# Altium schematic symbol library TI Amplifiers and Linear Special Function Amplifier.SchLib: 708 symbols (part 3 of 34) (continued)
## LM1877M-9/NOPB
designator U?
Dual Audio Power Amplifier, 0 to 70 degC, 14-pin SOIC (NPA14), Green (RoHS & no Sb/Br); Manufacturer: Texas Instruments; PartNumber: LM1877M-9/NOPB; Analog Supply Max [V]: 24; Analog Supply Min [V]: 6; Input Type: Analog; Max. Number of Speaker Outputs: 2; SubFamily: Mid/High-Power Amplifier; DatasheetVersion: SNAS550B; PackageVersion: Rev. D, 04/2013; PackageReference: NPA14; PackageDescription: 14-Pin Plastic Small Outline, Body 8.992 x 7.493 mm, Pitch 1.27 mm; Supplier 1: Digi-Key; Supplier Part Number 1: LM1877M-9/NOPB-ND; Supplier 2: Farnell; Supplier Part Number 2: 1685321; Supplier 3: Newark; Supplier Part Number 3: 41K3526; Supplier 4: Mouser; Supplier Part Number 4: 926-LM1877M-9/NOPB; Eco-Plan: Green (RoHS & no Sb/Br); Mounting Technology: Surface Mount; ComponentLink1Description: Manufacturer URL; ComponentLink1URL: http://www.ti.com/; ComponentLink2Description: Datasheet; ComponentLink2URL: http://www.ti.com/general/docs/lit/getliterature.tsp?genericPartNumber=LM1877&fileType=pdf; ComponentLink3Description: Package Specification; ComponentLink3URL: http://www.ti.com/lit/ds/symlink/lm1877.pdf
footprint TI-NPA14_N (SOIC, 14-Leads, Body 8.992x7.493mm, Pitch 1.27mm, IPC Medium Density)
footprint TI-NPA14_L (SOIC, 14-Leads, Body 8.992x7.493mm, Pitch 1.27mm, IPC High Density)
footprint TI-NPA14_M (SOIC, 14-Leads, Body 8.992x7.493mm, Pitch 1.27mm, IPC Low Density)
part A pins: 1 BIAS (in), 2 OUT1 (out), 6 IN1 (in), 7 FB1 (in), 8 FB2 (in), 9 IN2 (in), 13 OUT2 (out)
part B pins: 3 GND (power), 4 GND (power), 5 GND (power), 10 GND (power), 11 GND (power), 12 GND (power), 14 V+ (power)

## LM1877MX-9/NOPB
designator U?
Dual Audio Power Amplifier, 0 to 70 degC, 14-pin SOIC (NPA14), Green (RoHS & no Sb/Br); Manufacturer: Texas Instruments; PartNumber: LM1877MX-9/NOPB; Analog Supply Max [V]: 24; Analog Supply Min [V]: 6; Input Type: Analog; Max. Number of Speaker Outputs: 2; SubFamily: Mid/High-Power Amplifier; DatasheetVersion: SNAS550B; PackageVersion: Rev. D, 04/2013; PackageReference: NPA14; PackageDescription: 14-Pin Plastic Small Outline, Body 8.992 x 7.493 mm, Pitch 1.27 mm; Supplier 1: Digi-Key; Supplier Part Number 1: LM1877MX-9/NOPBTR-ND; Supplier 2: Digi-Key; Supplier Part Number 2: LM1877MX-9/NOPBCT-ND; Supplier 3: Digi-Key; Supplier Part Number 3: LM1877MX-9/NOPBDKR-ND; Supplier 4: Newark; Supplier Part Number 4: 41K3527; Supplier 5: Mouser; Supplier Part Number 5: 926-LM1877MX-9/NOPB; Eco-Plan: Green (RoHS & no Sb/Br); Mounting Technology: Surface Mount; ComponentLink1Description: Manufacturer URL; ComponentLink1URL: http://www.ti.com/; ComponentLink2Description: Datasheet; ComponentLink2URL: http://www.ti.com/general/docs/lit/getliterature.tsp?genericPartNumber=LM1877&fileType=pdf; ComponentLink3Description: Package Specification; ComponentLink3URL: http://www.ti.com/lit/ds/symlink/lm1877.pdf
footprint TI-NPA14_N (SOIC, 14-Leads, Body 8.992x7.493mm, Pitch 1.27mm, IPC Medium Density)
footprint TI-NPA14_L (SOIC, 14-Leads, Body 8.992x7.493mm, Pitch 1.27mm, IPC High Density)
footprint TI-NPA14_M (SOIC, 14-Leads, Body 8.992x7.493mm, Pitch 1.27mm, IPC Low Density)
part A pins: 1 BIAS (in), 2 OUT1 (out), 6 IN1 (in), 7 FB1 (in), 8 FB2 (in), 9 IN2 (in), 13 OUT2 (out)
part B pins: 3 GND (power), 4 GND (power), 5 GND (power), 10 GND (power), 11 GND (power), 12 GND (power), 14 V+ (power)

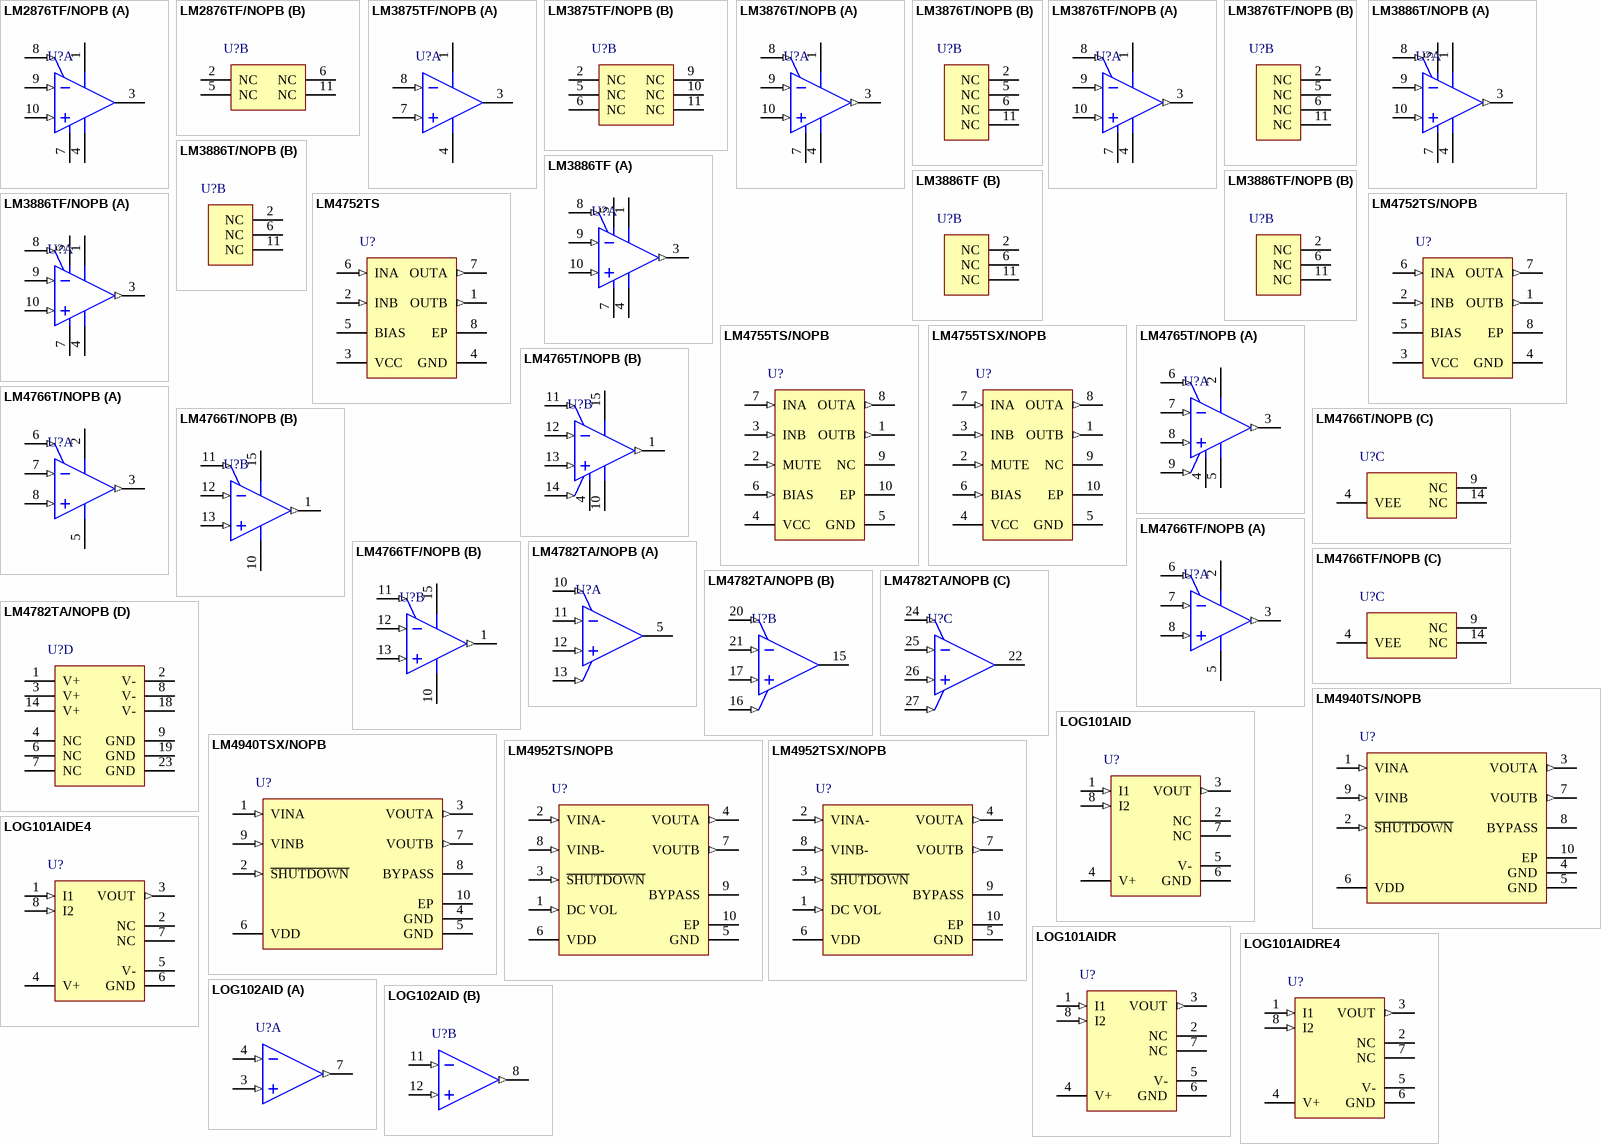
[diagram p3: symbols LM2876TF/NOPB to LOG102AID]

## LM2876TF/NOPB
designator U?
High-Performance 40 Watt Audio Power Amplifier with Mute, -20 to 85 degC, 11-pin FM (NDA11), Pb-Free (RoHS Exempt); Manufacturer: Texas Instruments; PartNumber: LM2876TF/NOPB; Input Type: Analog; Max. Number of Speaker Outputs: 1; SubFamily: Mid/High-Power Amplifier; DatasheetVersion: SNAS088C; PackageVersion: Rev. D, 02/2013; PackageReference: NDA11; PackageDescription: 11-Pin Metal Flange Mount, Body 20.02 x 4.5 mm, Pitch 1.7 mm; Supplier 1: Digi-Key; Supplier Part Number 1: LM2876TF/NOPB-ND; Supplier 2: Farnell; Supplier Part Number 2: 1694009; Supplier 3: Newark; Supplier Part Number 3: 41K4439; Supplier 4: Mouser; Supplier Part Number 4: 926-LM2876TF/NOPB; Eco-Plan: Pb-Free (RoHS Exempt); Mounting Technology: Through Hole; ComponentLink1Description: Manufacturer URL; ComponentLink1URL: http://www.ti.com/; ComponentLink2Description: Datasheet; ComponentLink2URL: http://www.ti.com/general/docs/lit/getliterature.tsp?genericPartNumber=LM2876&fileType=pdf; ComponentLink3Description: Package Specification; ComponentLink3URL: http://www.ti.com/lit/ml/mmsf015/mmsf015.pdf
footprint TI-NDA11 (FM, 11-Leads, Body 20.02x4.5mm, Pitch 1.7mm)
part A pins: 1 V+ (power), 3 OUT (hiz), 4 V- (power), 7 GND (power), 8 MUTE (in), 9 VIN- (in), 10 VIN+ (in)
part B pins: 2 NC, 5 NC, 6 NC, 11 NC

## LM3875TF/NOPB
designator U?
High-Performance 56 W Audio Power Amplifier, -20 to 85 degC, 11-pin FM (NDA11), Pb-Free (RoHS Exempt); Manufacturer: Texas Instruments; PartNumber: LM3875TF/NOPB; Analog Supply Max [V]: 20; Analog Supply Min [V]: 84; Input Type: Analog; SubFamily: Mid/High-Power Amplifier; DatasheetVersion: SNAS083D; PackageVersion: Rev. D, 02/2013; PackageReference: NDA11; PackageDescription: 11-Pin Metal Flange Mount, Body 20.02 x 4.5 mm, Pitch 1.7 mm; Supplier 1: Digi-Key; Supplier Part Number 1: LM3875TF/NOPB-ND; Supplier 2: Farnell; Supplier Part Number 2: 1468867; Supplier 3: Newark; Supplier Part Number 3: 41K5106; Supplier 4: Mouser; Supplier Part Number 4: 926-LM3875TF/NOPB; Eco-Plan: Pb-Free (RoHS Exempt); Mounting Technology: Through Hole; ComponentLink1Description: Manufacturer URL; ComponentLink1URL: http://www.ti.com/; ComponentLink2Description: Datasheet; ComponentLink2URL: http://www.ti.com/general/docs/lit/getliterature.tsp?genericPartNumber=LM3875&fileType=pdf; ComponentLink3Description: Package Specification; ComponentLink3URL: http://www.ti.com/lit/ml/mmsf015/mmsf015.pdf
footprint TI-NDA11 (FM, 11-Leads, Body 20.02x4.5mm, Pitch 1.7mm)
part A pins: 1 V+ (power), 3 OUT (hiz), 4 V- (power), 7 VIN+ (in), 8 VIN- (in)
part B pins: 2 NC, 5 NC, 6 NC, 9 NC, 10 NC, 11 NC

## LM3876T/NOPB
designator U?
High-Performance 56 W Audio Power Amplifier with Mute, -20 to 85 degC, 11-pin FM (NDJ11), Green (RoHS & no Sb/Br); Manufacturer: Texas Instruments; PartNumber: LM3876T/NOPB; Analog Supply Max [V]: 24; Analog Supply Min [V]: 84; Input Type: Analog; SubFamily: Mid/High-Power Amplifier; DatasheetVersion: SNAS090D; PackageVersion: Rev. B, 05/2013; PackageReference: NDJ11; PackageDescription: 11-Pin Metal Flange Mount, Body 20.02 x 4.5, Pitch 1.7 mm; Supplier 1: Digi-Key; Supplier Part Number 1: LM3876T/NOPB-ND; Supplier 2: Farnell; Supplier Part Number 2: 1184989; Supplier 3: Newark; Supplier Part Number 3: 41K5107; Supplier 4: Mouser; Supplier Part Number 4: 926-LM3876T/NOPB; Eco-Plan: Green (RoHS & no Sb/Br); Mounting Technology: Through Hole; ComponentLink1Description: Manufacturer URL; ComponentLink1URL: http://www.ti.com/; ComponentLink2Description: Datasheet; ComponentLink2URL: http://www.ti.com/general/docs/lit/getliterature.tsp?genericPartNumber=LM3876&fileType=pdf; ComponentLink3Description: Package Specification; ComponentLink3URL: http://www.ti.com/lit/ds/symlink/lm3886.pdf
footprint TI-NDJ11 (FM, 11-Leads, Body 20.02x4.5mm, Pitch 1.7mm)
part A pins: 1 V+ (power), 3 OUTPUT (out), 4 V- (power), 7 GND (power), 8 MUTE (in), 9 VIN- (in), 10 VIN+ (in)
part B pins: 2 NC, 5 NC, 6 NC, 11 NC

## LM3876TF/NOPB
designator U?
High-Performance 56 W Audio Power Amplifier with Mute, -20 to 85 degC, 11-pin FM (NDA11), Pb-Free (RoHS Exempt); Manufacturer: Texas Instruments; PartNumber: LM3876TF/NOPB; Analog Supply Max [V]: 24; Analog Supply Min [V]: 84; Input Type: Analog; SubFamily: Mid/High-Power Amplifier; DatasheetVersion: SNAS090D; PackageVersion: Rev. D, 02/2013; PackageReference: NDA11; PackageDescription: 11-Pin Metal Flange Mount, Body 20.02 x 4.5 mm, Pitch 1.7 mm; Supplier 1: Digi-Key; Supplier Part Number 1: LM3876TF/NOPB-ND; Supplier 2: Newark; Supplier Part Number 2: 41K5108; Supplier 3: Mouser; Supplier Part Number 3: 926-LM3876TF/NOPB; Eco-Plan: Pb-Free (RoHS Exempt); Mounting Technology: Through Hole; ComponentLink1Description: Manufacturer URL; ComponentLink1URL: http://www.ti.com/; ComponentLink2Description: Datasheet; ComponentLink2URL: http://www.ti.com/general/docs/lit/getliterature.tsp?genericPartNumber=LM3876&fileType=pdf; ComponentLink3Description: Package Specification; ComponentLink3URL: http://www.ti.com/lit/ml/mmsf015/mmsf015.pdf
footprint TI-NDA11 (FM, 11-Leads, Body 20.02x4.5mm, Pitch 1.7mm)
part A pins: 1 V+ (power), 3 OUTPUT (out), 4 V- (power), 7 GND (power), 8 MUTE (in), 9 VIN- (in), 10 VIN+ (in)
part B pins: 2 NC, 5 NC, 6 NC, 11 NC

## LM3886T/NOPB
designator U?
High-Performance 68 W Audio Power Amplifier with Mute, 0 to 70 degC, 11-pin FM (NDJ11), Green (RoHS & no Sb/Br); Manufacturer: Texas Instruments; PartNumber: LM3886T/NOPB; Input Type: Analog; SubFamily: Mid/High-Power Amplifier; DatasheetVersion: SNAS091C; PackageVersion: Rev. B, 05/2013; PackageReference: NDJ11; PackageDescription: 11-Pin Metal Flange Mount, Body 20.02 x 4.5, Pitch 1.7 mm; Supplier 1: Digi-Key; Supplier Part Number 1: LM3886T/NOPB-ND; Supplier 2: Farnell; Supplier Part Number 2: 1468869; Supplier 3: Newark; Supplier Part Number 3: 41K5109; Supplier 4: Mouser; Supplier Part Number 4: 926-LM3886T/NOPB; Eco-Plan: Green (RoHS & no Sb/Br); Mounting Technology: Through Hole; ComponentLink1Description: Manufacturer URL; ComponentLink1URL: http://www.ti.com/; ComponentLink2Description: Datasheet; ComponentLink2URL: http://www.ti.com/general/docs/lit/getliterature.tsp?genericPartNumber=LM3886&fileType=pdf; ComponentLink3Description: Package Specification; ComponentLink3URL: http://www.ti.com/lit/ds/symlink/lm3886.pdf
footprint TI-NDJ11 (FM, 11-Leads, Body 20.02x4.5mm, Pitch 1.7mm)
part A pins: 1 V+ (power), 3 OUTPUT (out), 4 V- (power), 5 V+ (power), 7 GND (power), 8 MUTE (in), 9 VIN- (in), 10 VIN+ (in)
part B pins: 2 NC, 6 NC, 11 NC

## LM3886TF
designator U?
High-Performance 68 W Audio Power Amplifier with Mute, 0 to 70 degC, 11-pin FM (NDA11); Manufacturer: Texas Instruments; PartNumber: LM3886TF; Input Type: Analog; SubFamily: Mid/High-Power Amplifier; DatasheetVersion: SNAS091C; PackageVersion: Rev. D, 02/2013; PackageReference: NDA11; PackageDescription: 11-Pin Metal Flange Mount, Body 20.02 x 4.5 mm, Pitch 1.7 mm; Supplier 1: Digi-Key; Supplier Part Number 1: LM3886TF-ND; Supplier 2: Farnell; Supplier Part Number 2: 9489681; Supplier 3: Farnell; Supplier Part Number 3: 1523846; Supplier 4: Newark; Supplier Part Number 4: 92F299; Supplier 5: Mouser; Supplier Part Number 5: 926-LM3886TF; Mounting Technology: Through Hole; ComponentLink1Description: Manufacturer URL; ComponentLink1URL: http://www.ti.com/; ComponentLink2Description: Datasheet; ComponentLink2URL: http://www.ti.com/general/docs/lit/getliterature.tsp?genericPartNumber=LM3886&fileType=pdf; ComponentLink3Description: Package Specification; ComponentLink3URL: http://www.ti.com/lit/ml/mmsf015/mmsf015.pdf
footprint TI-NDA11 (FM, 11-Leads, Body 20.02x4.5mm, Pitch 1.7mm)
part A pins: 1 V+ (power), 3 OUTPUT (out), 4 V- (power), 5 V+ (power), 7 GND (power), 8 MUTE (in), 9 VIN- (in), 10 VIN+ (in)
part B pins: 2 NC, 6 NC, 11 NC

## LM3886TF/NOPB
designator U?
High-Performance 68 W Audio Power Amplifier with Mute, 0 to 70 degC, 11-pin FM (NDA11), Pb-Free (RoHS Exempt); Manufacturer: Texas Instruments; PartNumber: LM3886TF/NOPB; Input Type: Analog; SubFamily: Mid/High-Power Amplifier; DatasheetVersion: SNAS091C; PackageVersion: Rev. D, 02/2013; PackageReference: NDA11; PackageDescription: 11-Pin Metal Flange Mount, Body 20.02 x 4.5 mm, Pitch 1.7 mm; Supplier 1: Digi-Key; Supplier Part Number 1: LM3886TF/NOPB-ND; Supplier 2: Farnell; Supplier Part Number 2: 1179742; Supplier 3: Newark; Supplier Part Number 3: 41K5110; Supplier 4: Mouser; Supplier Part Number 4: 926-LM3886TF/NOPB; Eco-Plan: Pb-Free (RoHS Exempt); Mounting Technology: Through Hole; ComponentLink1Description: Manufacturer URL; ComponentLink1URL: http://www.ti.com/; ComponentLink2Description: Datasheet; ComponentLink2URL: http://www.ti.com/general/docs/lit/getliterature.tsp?genericPartNumber=LM3886&fileType=pdf; ComponentLink3Description: Package Specification; ComponentLink3URL: http://www.ti.com/lit/ml/mmsf015/mmsf015.pdf
footprint TI-NDA11 (FM, 11-Leads, Body 20.02x4.5mm, Pitch 1.7mm)
part A pins: 1 V+ (power), 3 OUTPUT (out), 4 V- (power), 5 V+ (power), 7 GND (power), 8 MUTE (in), 9 VIN- (in), 10 VIN+ (in)
part B pins: 2 NC, 6 NC, 11 NC

## LM4752TS
designator U?
Stereo 11 W Audio Power Amplifier, 0 to 70 degC, 7-pin DPAK (KTW7); Manufacturer: Texas Instruments; PartNumber: LM4752TS; Input Type: Analog; Max. Number of Speaker Outputs: 2; SubFamily: Mid/High-Power Amplifier; DatasheetVersion: SNAS006E; PackageVersion: 4201284/A, 08/2001; PackageReference: KTW7; PackageDescription: 7-Pin Plastic Flange Mount, Body 8.89 x 10.1 mm, Pitch 1.27 mm; Supplier 1: Digi-Key; Supplier Part Number 1: LM4752TS-ND; Supplier 2: Farnell; Supplier Part Number 2: 1798325; Supplier 3: Newark; Supplier Part Number 3: 73R9744; Supplier 4: Newark; Supplier Part Number 4: 48F7272; Supplier 5: Mouser; Supplier Part Number 5: 926-LM4752TS; Mounting Technology: Surface Mount; Code_JEDEC: MO-169; ComponentLink1Description: Manufacturer URL; ComponentLink1URL: http://www.ti.com/; ComponentLink2Description: Datasheet; ComponentLink2URL: http://www.ti.com/general/docs/lit/getliterature.tsp?genericPartNumber=LM4752&fileType=pdf; ComponentLink3Description: Package Specification; ComponentLink3URL: http://www.ti.com/litv/pdf/mpsf015
footprint TI-KTW7_N (DPAK, 7-Leads, Body 9.4x10.4mm, Pitch 1.27mm, IPC Medium Density)
footprint TI-KTW7_L (DPAK, 7-Leads, Body 9.4x10.4mm, Pitch 1.27mm, IPC High Density)
footprint TI-KTW7_M (DPAK, 7-Leads, Body 9.4x10.4mm, Pitch 1.27mm, IPC Low Density)
pins: 1 OUTB (out), 2 INB (in), 3 VCC (power), 4 GND (power), 5 BIAS, 6 INA (in), 7 OUTA (out), 8 EP

## LM4752TS/NOPB
designator U?
Stereo 11 W Audio Power Amplifier, 0 to 70 degC, 7-pin DPAK (KTW7), Pb-Free (RoHS Exempt); Manufacturer: Texas Instruments; PartNumber: LM4752TS/NOPB; Input Type: Analog; Max. Number of Speaker Outputs: 2; SubFamily: Mid/High-Power Amplifier; DatasheetVersion: SNAS006E; PackageVersion: 4201284/A, 08/2001; PackageReference: KTW7; PackageDescription: 7-Pin Plastic Flange Mount, Body 8.89 x 10.1 mm, Pitch 1.27 mm; Supplier 1: Digi-Key; Supplier Part Number 1: LM4752TS/NOPB-ND; Supplier 2: Farnell; Supplier Part Number 2: 1853252; Supplier 3: Newark; Supplier Part Number 3: 41K5583; Supplier 4: Mouser; Supplier Part Number 4: 926-LM4752TS/NOPB; Eco-Plan: Pb-Free (RoHS Exempt); Mounting Technology: Surface Mount; Code_JEDEC: MO-169; ComponentLink1Description: Manufacturer URL; ComponentLink1URL: http://www.ti.com/; ComponentLink2Description: Datasheet; ComponentLink2URL: http://www.ti.com/general/docs/lit/getliterature.tsp?genericPartNumber=LM4752&fileType=pdf; ComponentLink3Description: Package Specification; ComponentLink3URL: http://www.ti.com/litv/pdf/mpsf015
footprint TI-KTW7_N (DPAK, 7-Leads, Body 9.4x10.4mm, Pitch 1.27mm, IPC Medium Density)
footprint TI-KTW7_L (DPAK, 7-Leads, Body 9.4x10.4mm, Pitch 1.27mm, IPC High Density)
footprint TI-KTW7_M (DPAK, 7-Leads, Body 9.4x10.4mm, Pitch 1.27mm, IPC Low Density)
pins: 1 OUTB (out), 2 INB (in), 3 VCC (power), 4 GND (power), 5 BIAS, 6 INA (in), 7 OUTA (out), 8 EP

## LM4755TS/NOPB
designator U?
Stereo 11 W Audio Power Amplifier with Mute, -40 to 85 degC, 9-pin DPAK (KTW9), Pb-Free (RoHS Exempt); Manufacturer: Texas Instruments; PartNumber: LM4755TS/NOPB; Input Type: Analog; Max. Number of Speaker Outputs: 2; SubFamily: Mid/High-Power Amplifier; DatasheetVersion: SNAS010E; PackageVersion: Rev. B, 04/2013; PackageReference: TI-KTW9; PackageDescription: 9-Pin Plastic Flange Mount, Bdoy 10.16 x 4.57 mm, Pitch 0.97 mm; Supplier 1: Digi-Key; Supplier Part Number 1: LM4755TS/NOPB-ND; Supplier 2: Farnell; Supplier Part Number 2: 1685378; Supplier 3: Newark; Supplier Part Number 3: 41K5585; Supplier 4: Mouser; Supplier Part Number 4: 926-LM4755TS/NOPB; Eco-Plan: Pb-Free (RoHS Exempt); Mounting Technology: Through Hole; ComponentLink1Description: Manufacturer URL; ComponentLink1URL: http://www.ti.com/; ComponentLink2Description: Datasheet; ComponentLink2URL: http://www.ti.com/general/docs/lit/getliterature.tsp?genericPartNumber=LM4755&fileType=pdf; ComponentLink3Description: Package Specification; ComponentLink3URL: http://www.ti.com/lit/ml/mpsf047/mpsf047.pdf
footprint TI-KTW9_N (DPAK, 9-Leads, Body 10.16x8.69mm, Pitch 0.97mm, IPC Medium Density)
footprint TI-KTW9_L (DPAK, 9-Leads, Body 10.16x8.69mm, Pitch 0.97mm, IPC High Density)
footprint TI-KTW9_M (DPAK, 9-Leads, Body 10.16x8.69mm, Pitch 0.97mm, IPC Low Density)
pins: 1 OUTB (out), 2 MUTE (in), 3 INB (in), 4 VCC (power), 5 GND (power), 6 BIAS (in), 7 INA (in), 8 OUTA (out), 9 NC, 10 EP

## LM4755TSX/NOPB
designator U?
Stereo 11 W Audio Power Amplifier with Mute, -40 to 85 degC, 9-pin DPAK (KTW9), Pb-Free (RoHS Exempt); Manufacturer: Texas Instruments; PartNumber: LM4755TSX/NOPB; Input Type: Analog; Max. Number of Speaker Outputs: 2; SubFamily: Mid/High-Power Amplifier; DatasheetVersion: SNAS010E; PackageVersion: Rev. B, 04/2013; PackageReference: TI-KTW9; PackageDescription: 9-Pin Plastic Flange Mount, Bdoy 10.16 x 4.57 mm, Pitch 0.97 mm; Supplier 1: Digi-Key; Supplier Part Number 1: LM4755TSX/NOPBTR-ND; Supplier 2: Digi-Key; Supplier Part Number 2: LM4755TSX/NOPBCT-ND; Supplier 3: Digi-Key; Supplier Part Number 3: LM4755TSX/NOPBDKR-ND; Supplier 4: Newark; Supplier Part Number 4: 41K5586; Supplier 5: Mouser; Supplier Part Number 5: 926-LM4755TSX/NOPB; Eco-Plan: Pb-Free (RoHS Exempt); Mounting Technology: Through Hole; ComponentLink1Description: Manufacturer URL; ComponentLink1URL: http://www.ti.com/; ComponentLink2Description: Datasheet; ComponentLink2URL: http://www.ti.com/general/docs/lit/getliterature.tsp?genericPartNumber=LM4755&fileType=pdf; ComponentLink3Description: Package Specification; ComponentLink3URL: http://www.ti.com/lit/ml/mpsf047/mpsf047.pdf
footprint TI-KTW9_N (DPAK, 9-Leads, Body 10.16x8.69mm, Pitch 0.97mm, IPC Medium Density)
footprint TI-KTW9_L (DPAK, 9-Leads, Body 10.16x8.69mm, Pitch 0.97mm, IPC High Density)
footprint TI-KTW9_M (DPAK, 9-Leads, Body 10.16x8.69mm, Pitch 0.97mm, IPC Low Density)
pins: 1 OUTB (out), 2 MUTE (in), 3 INB (in), 4 VCC (power), 5 GND (power), 6 BIAS (in), 7 INA (in), 8 OUTA (out), 9 NC, 10 EP

## LM4765T/NOPB
designator U?
Overture Audio Power Amplifier Series Dual 30 Watt Audio Power Amplifier with Mute & Standby Mode, -20 to 85 degC, 15-pin FM (NDL15), Green (RoHS & no Sb/Br); Manufacturer: Texas Instruments; PartNumber: LM4765T/NOPB; Input Type: Analog; Max. Number of Speaker Outputs: 2; SubFamily: Mid/High-Power Amplifier; DatasheetVersion: SNAS030C; PackageVersion: Rev. B, 04/2013; PackageReference: NDL15; PackageDescription: 15-Pin Metal Flange Mount, Body 20.02 x 4.5 mm, Pitch 1.27 mm; Supplier 1: Digi-Key; Supplier Part Number 1: LM4765T/NOPB-ND; Supplier 2: Farnell; Supplier Part Number 2: 1685341; Supplier 3: Newark; Supplier Part Number 3: 41K5588; Supplier 4: Mouser; Supplier Part Number 4: 926-LM4765T/NOPB; Eco-Plan: Green (RoHS & no Sb/Br); Mounting Technology: Through Hole; ComponentLink1Description: Manufacturer URL; ComponentLink1URL: http://www.ti.com/; ComponentLink2Description: Datasheet; ComponentLink2URL: http://www.ti.com/general/docs/lit/getliterature.tsp?genericPartNumber=LM4765&fileType=pdf; ComponentLink3Description: Package Specification; ComponentLink3URL: http://www.ti.com/lit/ds/symlink/lm1876.pdf
footprint TI-NDL15 (FM, 15-Leads, Body 20.02x4.5mm, Pitch 1.27mm)
pins on every part: 4 VEE (power)
part A pins: 2 VCC A (power), 3 OUT A (out), 5 GND A (power), 6 MUTE A (in), 7 IN A- (in), 8 IN A+ (in), 9 STANDBY A (in)
part B pins: 1 OUT B (out), 10 GND B (power), 11 MUTE B (in), 12 IN B- (in), 13 IN B+ (in), 14 STANDBY B (in), 15 VCC B (power)

## LM4766T/NOPB
designator U?
Overture Audio Power Amplifier Series Dual 40 Watt Audio Power Amplifier with Mute, -20 to 85 degC, 15-pin FM (NDL15), Green (RoHS & no Sb/Br); Manufacturer: Texas Instruments; PartNumber: LM4766T/NOPB; Input Type: Analog; Max. Number of Speaker Outputs: 2; SubFamily: Mid/High-Power Amplifier; DatasheetVersion: SNAS031F; PackageVersion: Rev. B, 04/2013; PackageReference: NDL15; PackageDescription: 15-Pin Metal Flange Mount, Body 20.02 x 4.5 mm, Pitch 1.27 mm; Supplier 1: Digi-Key; Supplier Part Number 1: LM4766T/NOPB-ND; Supplier 2: Newark; Supplier Part Number 2: 41K5589; Supplier 3: Mouser; Supplier Part Number 3: 926-LM4766T/NOPB; Eco-Plan: Green (RoHS & no Sb/Br); Mounting Technology: Through Hole; ComponentLink1Description: Manufacturer URL; ComponentLink1URL: http://www.ti.com/; ComponentLink2Description: Datasheet; ComponentLink2URL: http://www.ti.com/general/docs/lit/getliterature.tsp?genericPartNumber=LM4766&fileType=pdf; ComponentLink3Description: Package Specification; ComponentLink3URL: http://www.ti.com/lit/ds/symlink/lm1876.pdf
footprint TI-NDL15 (FM, 15-Leads, Body 20.02x4.5mm, Pitch 1.27mm)
part A pins: 2 VCC A (power), 3 OUT A (out), 5 GND A (power), 6 MUTE A (in), 7 IN A- (in), 8 IN A+ (in)
part B pins: 1 OUT B (out), 10 GND B (power), 11 MUTE B (in), 12 IN B- (in), 13 IN B+ (in), 15 VCC B (power)
part C pins: 4 VEE (power), 9 NC, 14 NC

## LM4766TF/NOPB
designator U?
Overture Audio Power Amplifier Series Dual 40 Watt Audio Power Amplifier with Mute, -20 to 85 degC, 15-pin FM (NDB15), Pb-Free (RoHS Exempt); Manufacturer: Texas Instruments; PartNumber: LM4766TF/NOPB; Input Type: Analog; Max. Number of Speaker Outputs: 2; SubFamily: Mid/High-Power Amplifier; DatasheetVersion: SNAS031F; PackageVersion: Rev. B, 02/2013; PackageReference: NDB15; PackageDescription: 15-Pin Metal Flange Mount, Body 20.02 x 4.5 mm, Pitch 1.27 mm; Supplier 1: Digi-Key; Supplier Part Number 1: LM4766TF/NOPB-ND; Supplier 2: Farnell; Supplier Part Number 2: 1685379; Supplier 3: Newark; Supplier Part Number 3: 41K5590; Supplier 4: Mouser; Supplier Part Number 4: 926-LM4766TF/NOPB; Eco-Plan: Pb-Free (RoHS Exempt); Mounting Technology: Through Hole; ComponentLink1Description: Manufacturer URL; ComponentLink1URL: http://www.ti.com/; ComponentLink2Description: Datasheet; ComponentLink2URL: http://www.ti.com/general/docs/lit/getliterature.tsp?genericPartNumber=LM4766&fileType=pdf; ComponentLink3Description: Package Specification; ComponentLink3URL: http://www.ti.com/lit/ml/mmsf016/mmsf016.pdf
footprint TI-NDB15 (FM, 15-Leads, Body 20.02x4.5mm, Pitch 1.27mm)
part A pins: 2 VCC A (power), 3 OUT A (out), 5 GND A (power), 6 MUTE A (in), 7 IN A- (in), 8 IN A+ (in)
part B pins: 1 OUT B (out), 10 GND B (power), 11 MUTE B (in), 12 IN B- (in), 13 IN B+ (in), 15 VCC B (power)
part C pins: 4 VEE (power), 9 NC, 14 NC

## LM4782TA/NOPB
designator U?
3 Channel 25 W Audio Power Amplifier with Mute and Standby, -20 to 85 degC, 27-pin TO-220 (NDM27), Green (RoHS & no Sb/Br); Manufacturer: Texas Instruments; PartNumber: LM4782TA/NOPB; Input Type: Analog; Max. Number of Speaker Outputs: 3; SubFamily: Mid/High-Power Amplifier; DatasheetVersion: SNAS231B; PackageVersion: Rev. B, 08/2012; PackageReference: NDM27; PackageDescription: 27-Pin Metal Flange Mount, Body 29.21 x 4.496 mm, Pitch 1 mm; Supplier 1: Digi-Key; Supplier Part Number 1: LM4782TA/NOPB-ND; Supplier 2: Mouser; Supplier Part Number 2: 926-LM4782TA/NOPB; Eco-Plan: Green (RoHS & no Sb/Br); Mounting Technology: Through Hole; ComponentLink1Description: Manufacturer URL; ComponentLink1URL: http://www.ti.com/; ComponentLink2Description: Datasheet; ComponentLink2URL: http://www.ti.com/general/docs/lit/getliterature.tsp?genericPartNumber=LM4782&fileType=pdf; ComponentLink3Description: Package Specification; ComponentLink3URL: http://www.ti.com/lit/ml/mmsf018/mmsf018.pdf
footprint TI-NDM27_V (NDM, 27-Leads, Body 29.21x4.496mm, Pitch 1mm)
part A pins: 5 OUT 1 (hiz), 10 MUTE 1 (in), 11 IN 1- (in), 12 IN 1+ (in), 13 STBY 1 (in)
part B pins: 15 OUT 2 (hiz), 16 STBY 2 (in), 17 IN 2+ (in), 20 MUTE 2 (in), 21 IN 2- (in)
part C pins: 22 OUT 3 (hiz), 24 MUTE 3 (in), 25 IN 3- (in), 26 IN 3+ (in), 27 STBY 3 (in)
part D pins: 1 V+ (power), 2 V- (power), 3 V+ (power), 4 NC, 6 NC, 7 NC, 8 V- (power), 9 GND (power), 14 V+ (power), 18 V- (power), 19 GND (power), 23 GND (power)

## LM4940TS/NOPB
designator U?
6 W Stereo Audio Power Amplifier, -40 to 85 degC, 9-pin DPAK (KTW9), Pb-Free (RoHS Exempt); Manufacturer: Texas Instruments; PartNumber: LM4940TS/NOPB; Input Type: Analog; Max. Number of Speaker Outputs: 2; SubFamily: Mid/High-Power Amplifier; DatasheetVersion: SNAS219C; PackageVersion: Rev. B, 04/2013; PackageReference: TI-KTW9; PackageDescription: 9-Pin Plastic Flange Mount, Bdoy 10.16 x 4.57 mm, Pitch 0.97 mm; Supplier 1: Digi-Key; Supplier Part Number 1: LM4940TS/NOPB-ND; Supplier 2: Mouser; Supplier Part Number 2: 926-LM4940TS/NOPB; Eco-Plan: Pb-Free (RoHS Exempt); Mounting Technology: Through Hole; ComponentLink1Description: Manufacturer URL; ComponentLink1URL: http://www.ti.com/; ComponentLink2Description: Datasheet; ComponentLink2URL: http://www.ti.com/general/docs/lit/getliterature.tsp?genericPartNumber=LM4940&fileType=pdf; ComponentLink3Description: Package Specification; ComponentLink3URL: http://www.ti.com/lit/ml/mpsf047/mpsf047.pdf
footprint TI-KTW9_N (DPAK, 9-Leads, Body 10.16x8.69mm, Pitch 0.97mm, IPC Medium Density)
footprint TI-KTW9_L (DPAK, 9-Leads, Body 10.16x8.69mm, Pitch 0.97mm, IPC High Density)
footprint TI-KTW9_M (DPAK, 9-Leads, Body 10.16x8.69mm, Pitch 0.97mm, IPC Low Density)
pins: 1 VINA (in), 2 ~{SHUTDOWN} (in), 3 VOUTA (out), 4 GND (power), 5 GND (power), 6 VDD (power), 7 VOUTB (out), 8 BYPASS, 9 VINB (in), 10 EP

## LM4940TSX/NOPB
designator U?
6 W Stereo Audio Power Amplifier, -40 to 85 degC, 9-pin DPAK (KTW9), Pb-Free (RoHS Exempt); Manufacturer: Texas Instruments; PartNumber: LM4940TSX/NOPB; Input Type: Analog; Max. Number of Speaker Outputs: 2; SubFamily: Mid/High-Power Amplifier; DatasheetVersion: SNAS219C; PackageVersion: Rev. B, 04/2013; PackageReference: TI-KTW9; PackageDescription: 9-Pin Plastic Flange Mount, Bdoy 10.16 x 4.57 mm, Pitch 0.97 mm; Supplier 1: Digi-Key; Supplier Part Number 1: LM4940TSX/NOPBTR-ND; Supplier 2: Digi-Key; Supplier Part Number 2: LM4940TSX/NOPBCT-ND; Supplier 3: Digi-Key; Supplier Part Number 3: LM4940TSX/NOPBDKR-ND; Supplier 4: Mouser; Supplier Part Number 4: 926-LM4940TSX/NOPB; Eco-Plan: Pb-Free (RoHS Exempt); Mounting Technology: Through Hole; ComponentLink1Description: Manufacturer URL; ComponentLink1URL: http://www.ti.com/; ComponentLink2Description: Datasheet; ComponentLink2URL: http://www.ti.com/general/docs/lit/getliterature.tsp?genericPartNumber=LM4940&fileType=pdf; ComponentLink3Description: Package Specification; ComponentLink3URL: http://www.ti.com/lit/ml/mpsf047/mpsf047.pdf
footprint TI-KTW9_N (DPAK, 9-Leads, Body 10.16x8.69mm, Pitch 0.97mm, IPC Medium Density)
footprint TI-KTW9_L (DPAK, 9-Leads, Body 10.16x8.69mm, Pitch 0.97mm, IPC High Density)
footprint TI-KTW9_M (DPAK, 9-Leads, Body 10.16x8.69mm, Pitch 0.97mm, IPC Low Density)
pins: 1 VINA (in), 2 ~{SHUTDOWN} (in), 3 VOUTA (out), 4 GND (power), 5 GND (power), 6 VDD (power), 7 VOUTB (out), 8 BYPASS, 9 VINB (in), 10 EP

## LM4952TS/NOPB
designator U?
3.1 W Stereo-SE Audio Power Amplifier with DC Volume Control, -40 to 85 degC, 9-pin DPAK (KTW9), Pb-Free (RoHS Exempt); Manufacturer: Texas Instruments; PartNumber: LM4952TS/NOPB; Input Type: Analog; Max. Number of Speaker Outputs: 2; SubFamily: Mid/High-Power Amplifier; DatasheetVersion: SNAS230A; PackageVersion: Rev. B, 04/2013; PackageReference: TI-KTW9; PackageDescription: 9-Pin Plastic Flange Mount, Bdoy 10.16 x 4.57 mm, Pitch 0.97 mm; Supplier 1: Digi-Key; Supplier Part Number 1: LM4952TS/NOPB-ND; Supplier 2: Newark; Supplier Part Number 2: 41K5994; Supplier 3: Mouser; Supplier Part Number 3: 926-LM4952TS/NOPB; Eco-Plan: Pb-Free (RoHS Exempt); Mounting Technology: Through Hole; ComponentLink1Description: Manufacturer URL; ComponentLink1URL: http://www.ti.com/; ComponentLink2Description: Datasheet; ComponentLink2URL: http://www.ti.com/general/docs/lit/getliterature.tsp?genericPartNumber=LM4952&fileType=pdf; ComponentLink3Description: Package Specification; ComponentLink3URL: http://www.ti.com/lit/ml/mpsf047/mpsf047.pdf
footprint TI-KTW9_N (DPAK, 9-Leads, Body 10.16x8.69mm, Pitch 0.97mm, IPC Medium Density)
footprint TI-KTW9_L (DPAK, 9-Leads, Body 10.16x8.69mm, Pitch 0.97mm, IPC High Density)
footprint TI-KTW9_M (DPAK, 9-Leads, Body 10.16x8.69mm, Pitch 0.97mm, IPC Low Density)
pins: 1 DC VOL (in), 2 VINA- (in), 3 ~{SHUTDOWN} (in), 4 VOUTA (out), 5 GND (power), 6 VDD (power), 7 VOUTB (out), 8 VINB- (in), 9 BYPASS, 10 EP